# Altium footprint library 排针排座.PcbLib: 344 footprints (part 20 of 22)
Each footprint in its own frame and in the unit in brackets; x right, y up, seen from the top. Pads: shape width x height; smd on the part's side, far side on the other; paste and mask are expansions set on the pad; w line width, h text height; cw(c..) or ccw(c..) is an arc to the next point about the centre after c.
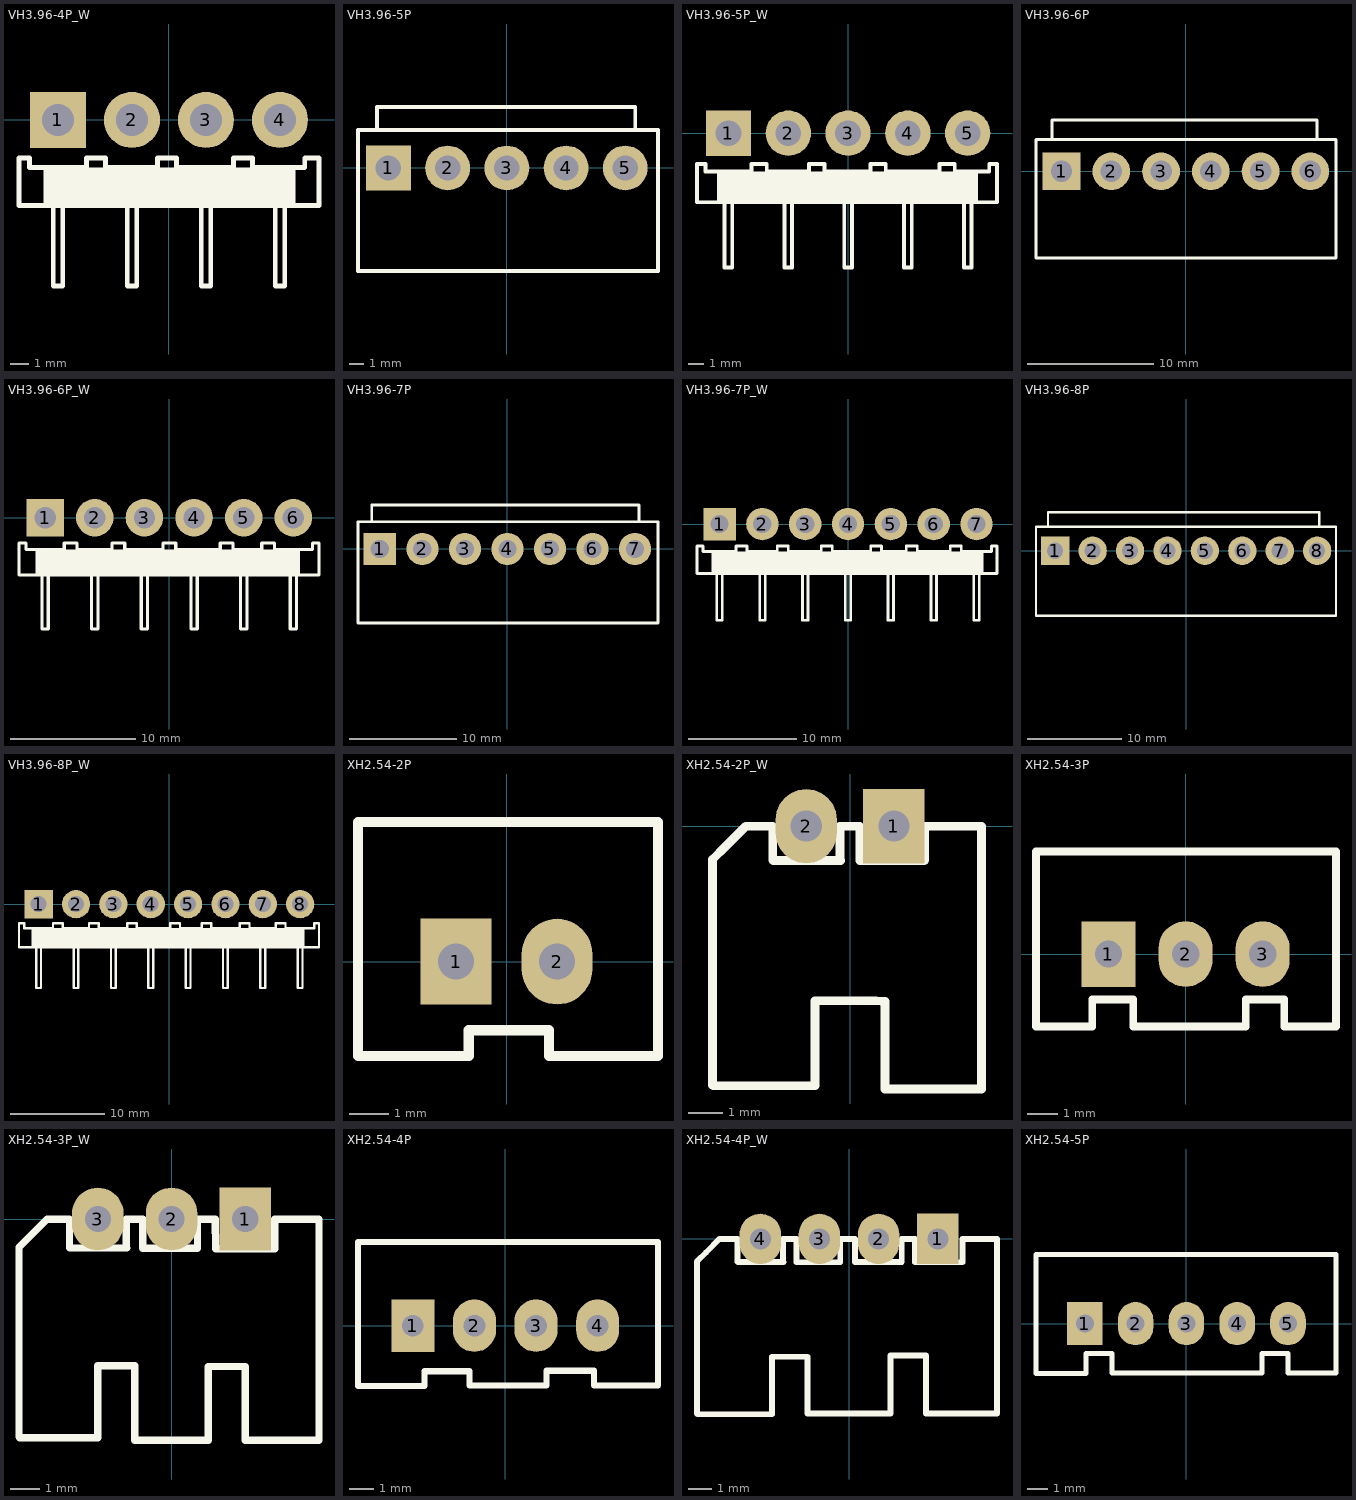
[diagram p19: the footprints below, top view; thin cyan lines are the x and y axes]

## VH3.96-4P_W [mm] "接插件，25V/5A"
pads (4):
  rect 3x3 hole 1.7: 1(-5.94,0)
  round 3 hole 1.7: 2(-1.978,0) 3(1.98,0) 4(5.94,0)
Top Overlay:
  rectangle: -6.702,-4.572 6.76,-2.54
  lines w0.254: -2.333,-4.572 -1.724,-4.572 -1.724,-8.89 -1.978,-8.89 -2.232,-8.89 -2.232,-4.572 ; 1.624,-4.572 2.234,-4.572 2.234,-8.89 1.98,-8.89 1.726,-8.89 1.726,-4.572 ; 5.584,-4.572 6.194,-4.572 6.194,-8.89 5.94,-8.89 5.686,-8.89 5.686,-4.572 ; -8.023,-4.572 -8.023,-2.032 -7.464,-2.032 -7.464,-2.54 -4.416,-2.54 -4.416,-2.032 -3.4,-2.032 -3.4,-2.54 -0.606,-2.54 -0.606,-2.032 0.105,-2.032 0.41,-2.032 0.41,-2.54 3.458,-2.54 3.458,-2.032 3.966,-2.032 4.474,-2.032 4.474,-2.54 7.268,-2.54 7.268,-2.032 8.03,-2.032 8.03,-2.54 8.03,-4.572 -6.194,-4.572 -6.194,-8.89 -5.94,-8.89 -5.686,-8.89 -5.686,-4.572 -6.296,-4.572 -8.023,-4.572
3D body "VH3.96-中H.STEP": height 8.76, standoff -3.55, extent -0.045,-12 4.005,0.6
3D body "VH3.96-左H.STEP": height 8.76, standoff -3.55, extent 3.915,-12 7.965,0.6
3D body "VH3.96-中H.STEP": height 8.76, standoff -3.55, extent -4.005,-12 0.045,0.6
3D body "VH3.96_H右.STEP": height 8.76, standoff -3.55, extent -7.965,-12 -3.915,0.6

## VH3.96-5P [mm] "接插件，25V/5A"
pads (5):
  rect 3x3 hole 1.7: 1(-7.921,0)
  round 3 hole 1.7: 2(-3.959,0) 3(0.001,0) 4(3.961,0) 5(7.921,0)
Top Overlay:
  lines w0.254: -8.683,2.54 -8.683,4.089 8.589,4.089 8.589,2.54 ; -9.953,-6.9 -8.277,-6.9 10.113,-6.9 10.113,2.54 -9.953,2.54 -9.953,-6.9
3D body "VH3.96-中.STEP": height 10.5, standoff -3.3, extent 1.956,-4.4 6.006,4.16
3D body "VH3.96-中.STEP": height 10.5, standoff -3.3, extent -2.001,-4.4 2.049,4.16
3D body "VH3.96-中.STEP": height 10.5, standoff -3.3, extent -5.961,-4.4 -1.911,4.16
3D body "VH3.96-左.STEP": height 10.5, standoff -3.3, extent -9.921,-4.4 -5.871,4.16
3D body "VH3.96右.STEP": height 10.5, standoff -3.3, extent 5.919,-4.4 9.969,4.16

## VH3.96-5P_W [mm] "接插件，25V/5A"
pads (5):
  rect 3x3 hole 1.7: 1(-7.92,0)
  round 3 hole 1.7: 2(-3.958,0) 3(0,0) 4(3.96,0) 5(7.92,0)
Top Overlay:
  rectangle: -8.682,-4.572 8.59,-2.54
  lines w0.254: -4.313,-4.572 -3.704,-4.572 -3.704,-8.89 -3.958,-8.89 -4.212,-8.89 -4.212,-4.572 ; -0.356,-4.572 0.254,-4.572 0.254,-8.89 0,-8.89 -0.254,-8.89 -0.254,-4.572 ; 3.604,-4.572 4.214,-4.572 4.214,-8.89 3.96,-8.89 3.706,-8.89 3.706,-4.572 ; 7.564,-4.572 8.174,-4.572 8.174,-8.89 7.92,-8.89 7.666,-8.89 7.666,-4.572 ; -10.003,-4.572 -8.276,-4.572 -7.666,-4.572 -7.666,-8.89 -7.92,-8.89 -8.174,-8.89 -8.174,-4.572 6.05,-4.572 9.86,-4.572 9.86,-2.032 9.352,-2.032 9.352,-2.54 7.066,-2.54 7.066,-2.032 6.05,-2.032 6.05,-2.54 2.494,-2.54 2.494,-2.032 1.986,-2.032 1.478,-2.032 1.478,-2.54 -1.57,-2.54 -1.57,-2.032 -1.875,-2.032 -2.586,-2.032 -2.586,-2.54 -5.38,-2.54 -5.38,-2.032 -6.396,-2.032 -6.396,-2.54 -9.444,-2.54 -9.444,-2.032 -10.003,-2.032 -10.003,-4.572
3D body "VH3.96_H右.STEP": height 8.76, standoff -3.55, extent -9.945,-12 -5.895,0.6
3D body "VH3.96-中H.STEP": height 8.76, standoff -3.55, extent 1.935,-12 5.985,0.6
3D body "VH3.96-中H.STEP": height 8.76, standoff -3.55, extent -5.985,-12 -1.935,0.6
3D body "VH3.96-左H.STEP": height 8.76, standoff -3.55, extent 5.895,-12 9.945,0.6
3D body "VH3.96-中H.STEP": height 8.76, standoff -3.55, extent -2.025,-12 2.025,0.6

## VH3.96-6P [mm] "接插件，25V/5A"
pads (6):
  rect 3x3 hole 1.7: 1(-9.901,0)
  round 3 hole 1.7: 2(-5.939,0) 3(-1.979,0) 4(1.981,0) 5(5.941,0) 6(9.901,0)
Top Overlay:
  lines w0.254: -10.663,2.54 -10.663,4.089 10.419,4.089 10.419,2.54 ; -11.933,-6.9 -11.933,2.54 11.943,2.54 11.943,-6.9 -10.257,-6.9 -11.933,-6.9
3D body "VH3.96-中.STEP": height 10.5, standoff -3.3, extent 3.936,-4.4 7.986,4.16
3D body "VH3.96-左.STEP": height 10.5, standoff -3.3, extent -11.901,-4.4 -7.851,4.16
3D body "VH3.96-中.STEP": height 10.5, standoff -3.3, extent -7.941,-4.4 -3.891,4.16
3D body "VH3.96-中.STEP": height 10.5, standoff -3.3, extent -3.981,-4.4 0.069,4.16
3D body "VH3.96-中.STEP": height 10.5, standoff -3.3, extent -0.024,-4.4 4.026,4.16
3D body "VH3.96右.STEP": height 10.5, standoff -3.3, extent 7.899,-4.4 11.949,4.16

## VH3.96-6P_W [mm] "接插件，25V/5A"
pads (6):
  rect 3x3 hole 1.7: 1(-9.9,0)
  round 3 hole 1.7: 2(-5.938,0) 3(-1.98,0) 4(1.98,0) 5(5.94,0) 6(9.9,0)
Top Overlay:
  rectangle: -10.662,-4.572 10.42,-2.54
  lines w0.254: -6.293,-4.572 -5.684,-4.572 -5.684,-8.89 -5.938,-8.89 -6.192,-8.89 -6.192,-4.572 ; -2.336,-4.572 -1.726,-4.572 -1.726,-8.89 -1.98,-8.89 -2.234,-8.89 -2.234,-4.572 ; 1.624,-4.572 2.234,-4.572 2.234,-8.89 1.98,-8.89 1.726,-8.89 1.726,-4.572 ; 5.584,-4.572 6.194,-4.572 6.194,-8.89 5.94,-8.89 5.686,-8.89 5.686,-4.572 ; 9.544,-4.572 10.154,-4.572 10.154,-8.89 9.9,-8.89 9.646,-8.89 9.646,-4.572 ; -11.983,-4.572 -11.983,-2.032 -11.424,-2.032 -11.424,-2.54 -8.376,-2.54 -8.376,-2.032 -7.36,-2.032 -7.36,-2.54 -4.566,-2.54 -4.566,-2.032 -3.855,-2.032 -3.55,-2.032 -3.55,-2.54 -0.502,-2.54 -0.502,-2.032 0.006,-2.032 0.514,-2.032 0.514,-2.54 4.07,-2.54 4.07,-2.032 5.086,-2.032 5.086,-2.54 7.372,-2.54 7.372,-2.032 7.88,-2.032 8.388,-2.032 8.388,-2.54 11.436,-2.54 11.436,-2.032 11.944,-2.032 11.944,-4.572 7.88,-4.572 4.07,-4.572 -10.154,-4.572 -10.154,-8.89 -9.9,-8.89 -9.646,-8.89 -9.646,-4.572 -10.256,-4.572 -11.983,-4.572
3D body "VH3.96_H右.STEP": height 8.76, standoff -3.55, extent -11.925,-12 -7.875,0.6
3D body "VH3.96-中H.STEP": height 8.76, standoff -3.55, extent 3.915,-12 7.965,0.6
3D body "VH3.96-中H.STEP": height 8.76, standoff -3.55, extent -4.005,-12 0.045,0.6
3D body "VH3.96-左H.STEP": height 8.76, standoff -3.55, extent 7.875,-12 11.925,0.6
3D body "VH3.96-中H.STEP": height 8.76, standoff -3.55, extent -7.965,-12 -3.915,0.6
3D body "VH3.96-中H.STEP": height 8.76, standoff -3.55, extent -0.045,-12 4.005,0.6

## VH3.96-7P [mm] "接插件，25V/5A"
pads (7):
  rect 3x3 hole 1.7: 1(-11.881,0)
  round 3 hole 1.7: 2(-7.919,0) 3(-3.959,0) 4(0.001,0) 5(3.961,0) 6(7.921,0) 7(11.881,0)
Top Overlay:
  lines w0.254: -12.643,2.54 -12.643,4.089 12.249,4.089 12.249,2.54 ; -13.913,-6.9 -13.913,2.54 14.027,2.54 14.027,-6.9 -12.237,-6.9 -13.913,-6.9
3D body "VH3.96右.STEP": height 10.5, standoff -3.3, extent 9.879,-4.4 13.929,4.16
3D body "VH3.96-中.STEP": height 10.5, standoff -3.3, extent 5.914,-4.4 9.964,4.16
3D body "VH3.96-中.STEP": height 10.5, standoff -3.3, extent 1.956,-4.4 6.006,4.16
3D body "VH3.96-左.STEP": height 10.5, standoff -3.3, extent -13.881,-4.4 -9.831,4.16
3D body "VH3.96-中.STEP": height 10.5, standoff -3.3, extent -9.921,-4.4 -5.871,4.16
3D body "VH3.96-中.STEP": height 10.5, standoff -3.3, extent -5.961,-4.4 -1.911,4.16
3D body "VH3.96-中.STEP": height 10.5, standoff -3.3, extent -2.004,-4.4 2.046,4.16

## VH3.96-7P_W [mm] "接插件，25V/5A"
pads (7):
  rect 3x3 hole 1.7: 1(-11.88,0)
  round 3 hole 1.7: 2(-7.918,0) 3(-3.96,0) 4(0,0) 5(3.96,0) 6(7.92,0) 7(11.88,0)
Top Overlay:
  rectangle: -12.642,-4.572 12.504,-2.54
  lines w0.254: -8.273,-4.572 -7.664,-4.572 -7.664,-8.89 -7.918,-8.89 -8.172,-8.89 -8.172,-4.572 ; -4.316,-4.572 -3.706,-4.572 -3.706,-8.89 -3.96,-8.89 -4.214,-8.89 -4.214,-4.572 ; -0.356,-4.572 0.254,-4.572 0.254,-8.89 0,-8.89 -0.254,-8.89 -0.254,-4.572 ; 3.604,-4.572 4.214,-4.572 4.214,-8.89 3.96,-8.89 3.706,-8.89 3.706,-4.572 ; 7.564,-4.572 8.174,-4.572 8.174,-8.89 7.92,-8.89 7.666,-8.89 7.666,-4.572 ; 11.524,-4.572 12.134,-4.572 12.134,-8.89 11.88,-8.89 11.626,-8.89 11.626,-4.572 ; -13.963,-4.572 -13.963,-2.032 -13.404,-2.032 -13.404,-2.54 -10.356,-2.54 -10.356,-2.032 -9.34,-2.032 -9.34,-2.54 -6.546,-2.54 -6.546,-2.032 -5.835,-2.032 -5.53,-2.032 -5.53,-2.54 -2.482,-2.54 -2.482,-2.032 -1.974,-2.032 -1.466,-2.032 -1.466,-2.54 2.09,-2.54 2.09,-2.032 3.106,-2.032 3.106,-2.54 5.392,-2.54 5.392,-2.032 5.9,-2.032 6.408,-2.032 6.408,-2.54 9.456,-2.54 9.456,-2.032 9.964,-2.032 10.472,-2.032 10.472,-2.54 13.266,-2.54 13.266,-2.032 13.774,-2.032 13.774,-4.572 9.964,-4.572 5.9,-4.572 2.09,-4.572 -12.134,-4.572 -12.134,-8.89 -11.88,-8.89 -11.626,-8.89 -11.626,-4.572 -12.236,-4.572 -13.963,-4.572
3D body "VH3.96-中H.STEP": height 8.76, standoff -3.55, extent 1.935,-12 5.985,0.6
3D body "VH3.96-中H.STEP": height 8.76, standoff -3.55, extent -5.985,-12 -1.935,0.6
3D body "VH3.96-左H.STEP": height 8.76, standoff -3.55, extent 9.855,-12 13.905,0.6
3D body "VH3.96-中H.STEP": height 8.76, standoff -3.55, extent -9.945,-12 -5.895,0.6
3D body "VH3.96-中H.STEP": height 8.76, standoff -3.55, extent -2.025,-12 2.025,0.6
3D body "VH3.96-中H.STEP": height 8.76, standoff -3.55, extent 5.895,-12 9.945,0.6
3D body "VH3.96_H右.STEP": height 8.76, standoff -3.55, extent -13.905,-12 -9.855,0.6

## VH3.96-8P [mm] "接插件，25V/5A"
pads (8):
  rect 3x3 hole 1.7: 1(-13.861,0)
  round 3 hole 1.7: 2(-9.899,0) 3(-5.939,0) 4(-1.979,0) 5(1.981,0) 6(5.941,0) 7(9.901,0) 8(13.861,0)
Top Overlay:
  lines w0.254: -14.623,2.54 -14.623,4.089 14.079,4.089 14.079,2.54 ; -15.893,-6.9 -15.893,2.54 15.857,2.54 15.857,-6.9 -14.217,-6.9 -15.893,-6.9
3D body "VH3.96-中.STEP": height 10.5, standoff -3.3, extent 7.896,-4.4 11.946,4.16
3D body "VH3.96-中.STEP": height 10.5, standoff -3.3, extent 3.934,-4.4 7.984,4.16
3D body "VH3.96-中.STEP": height 10.5, standoff -3.3, extent -0.024,-4.4 4.026,4.16
3D body "VH3.96-左.STEP": height 10.5, standoff -3.3, extent -15.861,-4.4 -11.811,4.16
3D body "VH3.96-中.STEP": height 10.5, standoff -3.3, extent -11.901,-4.4 -7.851,4.16
3D body "VH3.96-中.STEP": height 10.5, standoff -3.3, extent -7.941,-4.4 -3.891,4.16
3D body "VH3.96-中.STEP": height 10.5, standoff -3.3, extent -3.984,-4.4 0.066,4.16
3D body "VH3.96右.STEP": height 10.5, standoff -3.3, extent 11.859,-4.4 15.909,4.16

## VH3.96-8P_W [mm] "接插件，25V/5A"
pads (8):
  rect 3x3 hole 1.7: 1(-13.86,0)
  round 3 hole 1.7: 2(-9.898,0) 3(-5.94,0) 4(-1.98,0) 5(1.98,0) 6(5.94,0) 7(9.9,0) 8(13.86,0)
Top Overlay:
  rectangle: -14.622,-4.572 14.334,-2.54
  lines w0.254: -10.253,-4.572 -9.644,-4.572 -9.644,-8.89 -9.898,-8.89 -10.152,-8.89 -10.152,-4.572 ; -6.296,-4.572 -5.686,-4.572 -5.686,-8.89 -5.94,-8.89 -6.194,-8.89 -6.194,-4.572 ; -2.336,-4.572 -1.726,-4.572 -1.726,-8.89 -1.98,-8.89 -2.234,-8.89 -2.234,-4.572 ; 1.624,-4.572 2.234,-4.572 2.234,-8.89 1.98,-8.89 1.726,-8.89 1.726,-4.572 ; 5.584,-4.572 6.194,-4.572 6.194,-8.89 5.94,-8.89 5.686,-8.89 5.686,-4.572 ; 9.544,-4.572 10.154,-4.572 10.154,-8.89 9.9,-8.89 9.646,-8.89 9.646,-4.572 ; 13.504,-4.572 14.114,-4.572 14.114,-8.89 13.86,-8.89 13.606,-8.89 13.606,-4.572 ; -15.943,-4.572 -14.216,-4.572 -13.606,-4.572 -13.606,-8.89 -13.86,-8.89 -14.114,-8.89 -14.114,-4.572 0.11,-4.572 3.92,-4.572 7.984,-4.572 11.794,-4.572 15.858,-4.572 15.858,-2.032 15.35,-2.032 15.35,-2.54 12.302,-2.54 12.302,-2.032 11.794,-2.032 11.286,-2.032 11.286,-2.54 8.492,-2.54 8.492,-2.032 7.984,-2.032 7.476,-2.032 7.476,-2.54 4.428,-2.54 4.428,-2.032 3.92,-2.032 3.412,-2.032 3.412,-2.54 1.126,-2.54 1.126,-2.032 0.11,-2.032 0.11,-2.54 -3.446,-2.54 -3.446,-2.032 -3.954,-2.032 -4.462,-2.032 -4.462,-2.54 -7.51,-2.54 -7.51,-2.032 -7.815,-2.032 -8.526,-2.032 -8.526,-2.54 -11.32,-2.54 -11.32,-2.032 -12.336,-2.032 -12.336,-2.54 -15.384,-2.54 -15.384,-2.032 -15.943,-2.032 -15.943,-4.572
3D body "VH3.96-中H.STEP": height 8.76, standoff -3.55, extent 7.875,-12 11.925,0.6
3D body "VH3.96-中H.STEP": height 8.76, standoff -3.55, extent 3.915,-12 7.965,0.6
3D body "VH3.96-中H.STEP": height 8.76, standoff -3.55, extent -4.005,-12 0.045,0.6
3D body "VH3.96-中H.STEP": height 8.76, standoff -3.55, extent -11.925,-12 -7.875,0.6
3D body "VH3.96-左H.STEP": height 8.76, standoff -3.55, extent 11.835,-12 15.885,0.6
3D body "VH3.96-中H.STEP": height 8.76, standoff -3.55, extent -7.965,-12 -3.915,0.6
3D body "VH3.96-中H.STEP": height 8.76, standoff -3.55, extent -0.045,-12 4.005,0.6
3D body "VH3.96_H右.STEP": height 8.76, standoff -3.55, extent -15.885,-12 -11.835,0.6

## XH2.54-2P [mil] "接插件，2P"
pads (2):
  rect 70x85 hole 35.43: 1(-50,0)
  oval 70x85 hole 35.43: 2(50,0)
Top Overlay:
  lines w10: -147.1,-93.3 -147.1,138 149.9,138 149.9,-93.3 42,-93.3 42,-68 -37.5,-68 -37.5,-93.3 -116.3,-93.3 -147.1,-93.3
3D body "XH2.54-2P.STEP": height 277.56, standoff -96.46, extent -148.43,-94.49 148.43,129.92

## XH2.54-2P_W [mil] "接插件，2P"
pads (2):
  rect 70x85 hole 35.43: 1(50,0)
  oval 70x85 hole 35.43: 2(-50,0)
Top Overlay:
  lines w10: 85.2,0 85.2,-38.9 84.65,-39.45 11.18,-39.45 11.18,0 -11.34,0 -11.34,-38.66 -10.79,-39.21 -87.8,-39.21 -88.35,-38.66 -88.35,0 -118.9,0 -141.81,-22.91 -156.93,-38.03 -156.93,-295.35 -155.91,-296.38 -40,-296.38 -40,-199.13 30,-199.13 40,-200 40,-300 50,-300 150,-300 150,0 109.21,0 85.67,0
3D body "XH2.54-2P_H.STEP": height 225.59, standoff -132.68, extent -148.43,-289.37 148.43,13.78

## XH2.54-3P [mil] "接插件，3P"
pads (3):
  rect 70x85 hole 35.43: 1(-100,0)
  oval 70x85 hole 35.43: 2(0,0) 3(100,0)
Top Overlay:
  lines w10: -194,-94 -194,133 195,133 195,-94 128,-94 128,-59.05 78,-59.05 78,-94 -68,-94 -68,-59.05 -121,-59.05 -121,-94 -194,-94
3D body "XH2.54-3P.STEP": height 276.77, standoff -97.24, extent -198.43,-94.49 198.43,129.92

## XH2.54-3P_W [mil] "接插件，3P"
pads (3):
  rect 70x85 hole 35.43: 1(100,0)
  oval 70x85 hole 35.43: 2(0,0) 3(-100,0)
Top Overlay:
  lines w10: 35.2,0 35.2,-38.9 34.65,-39.45 -38.82,-39.45 -38.82,0 -61.34,0 -61.34,-38.66 -60.79,-39.21 -137.8,-39.21 -138.35,-38.66 -138.35,0 -168.9,0 -191.81,-22.91 -206.93,-38.03 -206.93,-295.35 -205.91,-296.38 -100,-296.38 -100,-199.13 -50,-199.13 -50,-300 0,-300 50,-300 50,-200 100,-200 100,-300 200,-300 200,0 159.21,0 140,0 140,-40 60,-40 59.21,0 35.67,0
3D body "XH2.54-3P_H.STEP": height 225.59, standoff -132.68, extent -198.43,-289.37 198.43,13.78

## XH2.54-4P [mil] "接插件，4P"
pads (4):
  rect 70x85 hole 35.43: 1(-150,0)
  oval 70x85 hole 35.43: 2(-50,0) 3(50,0) 4(150,0)
Top Overlay:
  lines w10: -239,-98 -239,136 248,136 248,-97 144,-97 144,-73 67,-73 67,-97 -58,-97 -58,-74 -131,-74 -131,-98 -239,-98
3D body "XH2.54-4P.STEP": height 276.77, standoff -97.24, extent -248.43,-94.49 248.43,129.92

## XH2.54-4P_W [mil] "接插件，4P"
pads (4):
  rect 70x85 hole 35.43: 1(150,0)
  oval 70x85 hole 35.43: 2(50,0) 3(-50,0) 4(-150,0)
Top Overlay:
  lines w10: -14.8,0 -14.8,-38.9 -15.35,-39.45 -88.82,-39.45 -88.82,0 -111.34,0 -111.34,-38.66 -110.79,-39.21 -187.8,-39.21 -188.35,-38.66 -188.35,0 -218.9,0 -241.81,-22.91 -256.93,-38.03 -256.93,-295.35 -255.91,-296.38 -130,-296.38 -130,-199.13 -70,-199.13 -70,-295.35 70,-295.35 70,-197.09 130,-197.09 130,-294.88 250,-294.88 250,0 193.54,0 ; -14.33,0 9.21,0 ; 9.76,-39.21 9.76,0 ; 10.55,-39.21 88.82,-39.21 89.06,-38.98 89.06,0 110.55,0 ; 111.1,0 111.1,-39.45 191.97,-39.45 ; 191.97,-38.43 191.97,0
3D body "XH2.54-4P_H.STEP": height 225.59, standoff -132.68, extent -248.43,-289.37 248.43,13.78

## XH2.54-5P [mil] "接插件，5P"
pads (5):
  rect 70x85 hole 35.43: 1(-200,0)
  oval 70x85 hole 35.43: 2(-100,0) 3(0,0) 4(100,0) 5(200,0)
Top Overlay:
  lines w10: 148.82,-97 -146.46,-97 -146.46,-59.05 -197.64,-59.05 -197.64,-98 -296.06,-98 -296.06,136 294.49,136 294.49,-97 200,-97 200,-59.05 148.82,-59.05 148.82,-96
3D body "XH2.54-5P.STEP": height 276.77, standoff -97.24, extent -298.43,-94.49 298.43,129.92